# Altium footprint library User.PcbLib: 317 footprints (part 6 of 20)
Each footprint in its own frame and in the unit in brackets; x right, y up, seen from the top. Pads: shape width x height; smd on the part's side, far side on the other; paste and mask are expansions set on the pad; w line width, h text height; cw(c..) or ccw(c..) is an arc to the next point about the centre after c.
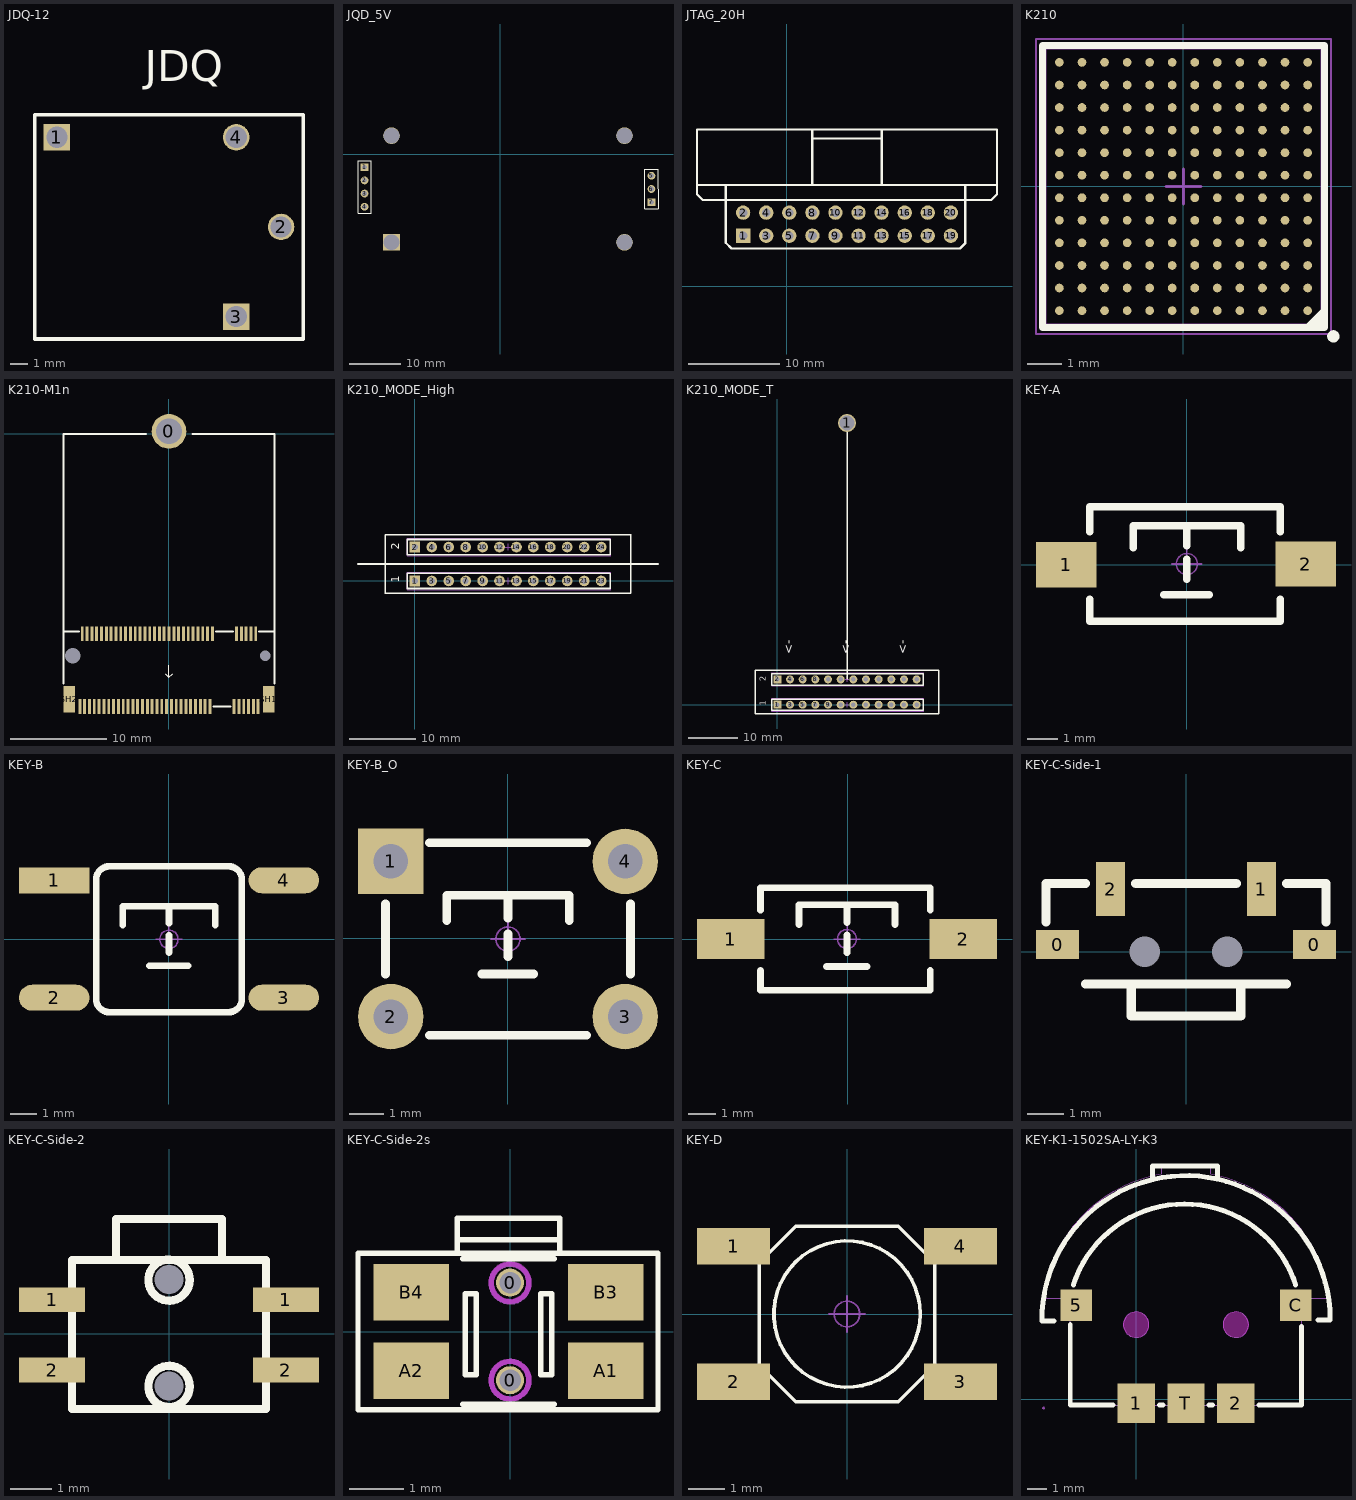
[diagram p5: the footprints below, top view; thin cyan lines are the x and y axes]

## JDQ-12 [mm]
pads (4):
  rect 1.5x1.5 hole 1.2: 1(-131.98,-213.57) 3(-121.82,-223.73)
  round 1.5 hole 1.2: 2(-119.28,-218.65) 4(-121.82,-213.57)
Top Overlay:
  lines w0.2: -133.25,-225 -130.71,-225 -128.17,-225 -125.63,-225 -123.09,-225 -120.55,-225 -118.01,-225 -118.01,-212.3 -120.55,-212.3 -123.09,-212.3 -125.63,-212.3 -128.17,-212.3 -130.71,-212.3 -133.25,-212.3 -133.25,-225
  text "JDQ" at -127,-211 h3
3D body: height 10, standoff 2, extent -134,-226 -117,-212

## JQD_5V [mm]
pads (11):
  rect 1.5x1.5 hole 0.9: 1(-26.2,-2.5) 7(29.2,-9.24)
  round 1.5 hole 0.9: 2(-26.2,-5.04) 3(-26.2,-7.58) 4(-26.2,-10.12) 5(29.2,-4.16) 6(29.2,-6.7)
  rect 3.2x3.2 hole 3: ""(-21,-17)
  round 3.2 hole 3: ""(-21,3.6) ""(24,-17) ""(24,3.6)
Top Overlay:
  lines w0.2: -27.47,-11.39 -24.93,-11.39 -24.93,-1.23 -27.47,-1.23 -27.47,-11.39 ; 27.93,-10.51 30.47,-10.51 30.47,-2.89 27.93,-2.89 27.93,-10.51

## JTAG_20H [mil]
pads (20):
  rect 62x62 hole 38: 1(-188.98,218.9)
  round 62 hole 38: 2(-188.98,318.9) 3(-88.98,218.9) 4(-88.98,318.9) 5(11.02,218.9) 6(11.02,318.9) 7(111.02,218.9) 8(111.02,318.9) 9(211.02,218.9) 10(211.02,318.9) 11(311.02,218.9) 12(311.02,318.9) 13(411.02,218.9) 14(411.02,318.9) 15(511.02,218.9) 16(511.02,318.9) 17(611.02,218.9) 18(611.02,318.9) 19(711.02,218.9) 20(711.02,318.9)
Top Overlay:
  lines w8: -265.1,438.9 -263.98,437.78
  lines w10: -263.98,437.78 -263.98,188.9 -238.98,163.9 751.02,163.9 772.9,185.78 772.9,438.9 ; 111.02,442.3 111.02,658.9 ; 111.02,678.9 111.02,639.97 411.02,639.97 411.02,678.9 ; 411.02,440.47 411.02,658.9 ; -388.98,438.9 -388.98,398.9 -363.98,373.9 -263.98,373.9 772.9,373.9 886.02,373.9 911.02,398.9 911.02,438.9 ; -388.98,438.9 -388.98,678.9 911.02,678.9 911.02,438.9 ; -388.98,438.9 911.02,438.9

## K210 [mm]
pads (144):
  round 0.25 smd mask+0.051: A1(3.575,-3.575) A2(2.925,-3.575) A3(2.275,-3.575) A4(1.625,-3.575) A5(0.975,-3.575) A6(0.325,-3.575) A7(-0.325,-3.575) A8(-0.975,-3.575) A9(-1.625,-3.575) A10(-2.275,-3.575) A11(-2.925,-3.575) A12(-3.575,-3.575) B1(3.575,-2.925) B2(2.925,-2.925) B3(2.275,-2.925) B4(1.625,-2.925) B5(0.975,-2.925) B6(0.325,-2.925) B7(-0.325,-2.925) B8(-0.975,-2.925) B9(-1.625,-2.925) B10(-2.275,-2.925) B11(-2.925,-2.925) B12(-3.575,-2.925) C1(3.575,-2.275) C2(2.925,-2.275) C3(2.275,-2.275) C4(1.625,-2.275) C5(0.975,-2.275) C6(0.325,-2.275) C7(-0.325,-2.275) C8(-0.975,-2.275) C9(-1.625,-2.275) C10(-2.275,-2.275) C11(-2.925,-2.275) C12(-3.575,-2.275) D1(3.575,-1.625) D2(2.925,-1.625) D3(2.275,-1.625) D4(1.625,-1.625) D5(0.975,-1.625) D6(0.325,-1.625) D7(-0.325,-1.625) D8(-0.975,-1.625) D9(-1.625,-1.625) D10(-2.275,-1.625) D11(-2.925,-1.625) D12(-3.575,-1.625) E1(3.575,-0.975) E2(2.925,-0.975) E3(2.275,-0.975) E4(1.625,-0.975) E5(0.975,-0.975) E6(0.325,-0.975) E7(-0.325,-0.975) E8(-0.975,-0.975) E9(-1.625,-0.975) E10(-2.275,-0.975) E11(-2.925,-0.975) E12(-3.575,-0.975) F1(3.575,-0.325) F2(2.925,-0.325) F3(2.275,-0.325) F4(1.625,-0.325) F5(0.975,-0.325) F6(0.325,-0.325) F7(-0.325,-0.325) F8(-0.975,-0.325) F9(-1.625,-0.325) F10(-2.275,-0.325) F11(-2.925,-0.325) F12(-3.575,-0.325) G1(3.575,0.325) G2(2.925,0.325) G3(2.275,0.325) G4(1.625,0.325) G5(0.975,0.325) G6(0.325,0.325) G7(-0.325,0.325) G8(-0.975,0.325) G9(-1.625,0.325) G10(-2.275,0.325) G11(-2.925,0.325) G12(-3.575,0.325) H1(3.575,0.975) H2(2.925,0.975) H3(2.275,0.975) H4(1.625,0.975) H5(0.975,0.975) H6(0.325,0.975) H7(-0.325,0.975) H8(-0.975,0.975) H9(-1.625,0.975) H10(-2.275,0.975) H11(-2.925,0.975) H12(-3.575,0.975) J1(3.575,1.625) J2(2.925,1.625) J3(2.275,1.625) J4(1.625,1.625) J5(0.975,1.625) J6(0.325,1.625) J7(-0.325,1.625) J8(-0.975,1.625) J9(-1.625,1.625) J10(-2.275,1.625) J11(-2.925,1.625) J12(-3.575,1.625) K1(3.575,2.275) K2(2.925,2.275) K3(2.275,2.275) K4(1.625,2.275) K5(0.975,2.275) K6(0.325,2.275) K7(-0.325,2.275) K8(-0.975,2.275) K9(-1.625,2.275) K10(-2.275,2.275) K11(-2.925,2.275) K12(-3.575,2.275) L1(3.575,2.925) L2(2.925,2.925) L3(2.275,2.925) L4(1.625,2.925) L5(0.975,2.925) L6(0.325,2.925) L7(-0.325,2.925) L8(-0.975,2.925) L9(-1.625,2.925) L10(-2.275,2.925) L11(-2.925,2.925) L12(-3.575,2.925) M1(3.575,3.575) M2(2.925,3.575) M3(2.275,3.575) M4(1.625,3.575) M5(0.975,3.575) M6(0.325,3.575) M7(-0.325,3.575) M8(-0.975,3.575) M9(-1.625,3.575) M10(-2.275,3.575) M11(-2.925,3.575) M12(-3.575,3.575)
Top Overlay:
  circle w0.2: c4.318,-4.318 r0.076
  region: 4.064,-4.064 3.429,-4.064 4.064,-3.429
  lines w0.2: -4.064,-4.064 -4.064,4.064 4.064,4.064 4.064,-4.064 -4.064,-4.064
Mechanical 13:
  lines w0.1: -4,-4 -4,4 4,4 4,-4 -4,-4
Mechanical 15:
  lines w0.05: -4.25,-4.25 4.25,-4.25 4.25,4.25 -4.25,4.25 -4.25,-4.25
  lines w0.1: -0.5,0 0.5,0 ; 0,-0.5 0,0.5
3D body "BGA144C65P12X12_800X800X95.step": height 0.95, standoff 0.01, extent -4,-4 4,4

## K210-M1n [mm]
pads (72):
  round 3.6 hole 2.65 mask+0.051: 0(0,0.254)
  rect 0.3x1.55 smd: 1(9.25,-28.287) 2(9,-20.737) 3(8.75,-28.287) 4(8.5,-20.737) 5(8.25,-28.287) 6(8,-20.737) 7(7.75,-28.287) 8(7.5,-20.737) 9(7.25,-28.287) 10(7,-20.737) 11(6.75,-28.287) 20(4.5,-20.737) 21(4.25,-28.287) 22(4,-20.737) 23(3.75,-28.287) 24(3.5,-20.737) 25(3.25,-28.287) 26(3,-20.737) 27(2.75,-28.287) 28(2.5,-20.737) 29(2.25,-28.287) 30(2,-20.737) 31(1.75,-28.287) 32(1.5,-20.737) 33(1.25,-28.287) 34(1,-20.737) 35(0.75,-28.287) 36(0.5,-20.737) 37(0.25,-28.287) 38(0,-20.737) 39(-0.25,-28.287) 40(-0.5,-20.737) 41(-0.75,-28.287) 42(-1,-20.737) 43(-1.25,-28.287) 44(-1.5,-20.737) 45(-1.75,-28.287) 46(-2,-20.737) 47(-2.25,-28.287) 48(-2.5,-20.737) 49(-2.75,-28.287) 50(-3,-20.737) 51(-3.25,-28.287) 52(-3.5,-20.737) 53(-3.75,-28.287) 54(-4,-20.737) 55(-4.25,-28.287) 56(-4.5,-20.737) 57(-4.75,-28.287) 58(-5,-20.737) 59(-5.25,-28.287) 60(-5.5,-20.737) 61(-5.75,-28.287) 62(-6,-20.737) 63(-6.25,-28.287) 64(-6.5,-20.737) 65(-6.75,-28.287) 66(-7,-20.737) 67(-7.25,-28.287) 68(-7.5,-20.737) 69(-7.75,-28.287) 70(-8,-20.737) 71(-8.25,-28.287) 72(-8.5,-20.737) 73(-8.75,-28.287) 74(-9,-20.737) 75(-9.25,-28.287)
  round 0 / inner round 1.524 / far side round 1.6 hole 1.6: " "(-10,-23.012)
  round 0 / inner round 1.524 / far side round 1.1 hole 1.1: " "(10,-23.012)
  rect 1.2x2.75 smd: SH1(10.35,-27.512) SH2(-10.35,-27.512)
Top Overlay:
  lines w0.125: -0.375,-24.887 0,-25.262 ; 0,-24.012 0,-25.262 ; 0.375,-24.887 0,-25.262
  lines w0.2: -10.95,-25.912 -10.95,-20.512 -9.35,-20.512 ; -10.95,-20.512 -10.95,0 -2.388,0 ; 2.413,0 10.95,0 10.95,-20.512 ; 4.6,-28.262 6.4,-28.262 ; 4.85,-20.512 6.65,-20.512 ; 9.35,-20.512 10.95,-20.512 ; 10.95,-25.912 10.95,-20.512
3D body "K210-NGFF-2663.step": height 5.5, standoff 2.21, extent -11.034,-24.865 10.947,0.125
3D body "2377473_2199230-3.stp": height 4.09, standoff -0.61, extent -10.95,-28.862 10.95,-20.162

## K210_MODE_High [mm] "li"
pads (24):
  rect 1.6x1.6 hole 0.9: 1(0,0) 2(0,5.08)
  round 1.6 hole 0.9: 3(2.54,0) 4(2.54,5.08) 5(5.08,0) 6(5.08,5.08) 7(7.62,0) 8(7.62,5.08) 9(10.16,0) 10(10.16,5.08) 11(12.7,0) 12(12.7,5.08) 13(15.24,0) 14(15.24,5.08) 15(17.78,0) 16(17.78,5.08) 17(20.32,0) 18(20.32,5.08) 19(22.86,0) 20(22.86,5.08) 21(25.4,0) 22(25.4,5.08) 23(27.94,0) 24(27.94,5.08)
Top Overlay:
  lines w0.254: -8.53,2.54 36.47,2.54 ; -4.445,-1.86 -4.445,6.94 32.385,6.94 ; -4.445,-1.86 -4.445,-1.86 ; -4.445,-1.86 32.385,-1.86 ; 32.385,-1.86 32.385,-1.86 ; 32.385,-1.86 32.385,6.94 ; 32.385,6.94 32.385,6.94 ; -1.143,-1.143 29.3,-1.143 29.3,1.143 -1.143,1.143 -1.143,-1.143 ; -1.143,3.937 29.3,3.937 29.3,6.223 -1.143,6.223 -1.143,3.937
  text "2" at -1.905,4.699 h2.03
  text "1" at -1.905,-0.254 h2.03
Mechanical 15:
  lines w0.1: 13.47,0 14.47,0 ; 13.47,5.08 14.47,5.08 ; 13.97,-0.5 13.97,0.5 ; 13.97,4.58 13.97,5.58 ; -1.13,-1.3 29.37,-1.3 29.37,1.3 -1.13,1.3 -1.13,-1.3 ; -1.13,3.78 29.37,3.78 29.37,6.38 -1.13,6.38 -1.13,3.78
3D body: height 15, standoff 0, extent -4.445,-1.86 -1.778,6.94
3D body: height 15, standoff 0, extent 29.718,-1.86 32.385,6.94
3D body: height 15, standoff 0, extent -1.778,-1.86 29.718,-1.228
3D body: height 15, standoff 0, extent -1.778,6.38 29.718,6.94
3D body: height 40, standoff 8, extent -1.143,1.397 29.337,3.81
3D body "HEADER 2.54X12.stp": height 8.3, standoff -2.9, extent -1.143,-1.228 29.337,1.27
3D body "HEADER 2.54X12.stp": height 8.3, standoff -2.9, extent -1.143,3.852 29.337,6.35

## K210_MODE_T [mm]
pads (25):
  rect 1.6x1.6 hole 0.9: 1(0,0) 2(0,5.08)
  round 3.6 hole 3.048: 1(13.97,56.53)
  round 1.6 hole 0.9: 3(2.54,0) 4(2.54,5.08) 5(5.08,0) 6(5.08,5.08) 7(7.62,0) 8(7.62,5.08) 9(10.16,0) 10(10.16,5.08) 11(12.7,0) 12(12.7,5.08) 13(15.24,0) 14(15.24,5.08) 15(17.78,0) 16(17.78,5.08) 17(20.32,0) 18(20.32,5.08) 19(22.86,0) 20(22.86,5.08) 21(25.4,0) 22(25.4,5.08) 23(27.94,0) 24(27.94,5.08)
Top Overlay:
  lines w0.254: 13.97,5.08 13.97,56.53 ; -4.445,-1.86 -4.445,6.94 32.385,6.94 ; -4.445,-1.86 -4.445,-1.86 ; -4.445,-1.86 32.385,-1.86 ; 32.385,-1.86 32.385,-1.86 ; 32.385,-1.86 32.385,6.94 ; 32.385,6.94 32.385,6.94 ; -1.143,-1.143 29.3,-1.143 29.3,1.143 -1.143,1.143 -1.143,-1.143 ; -1.143,3.937 29.3,3.937 29.3,6.223 -1.143,6.223 -1.143,3.937
  text "2" at -1.905,4.699 h2.03
  text "1" at -1.905,-0.254 h2.03
  text "<-" at 3.717,10.08 h3.05
  text "<-" at 26.577,10.08 h3.05
  text "<-" at 15.147,10.08 h3.05
Mechanical 15:
  lines w0.1: 13.47,0 14.47,0 ; 13.47,5.08 14.47,5.08 ; 13.97,-0.5 13.97,0.5 ; 13.97,4.58 13.97,5.58 ; -1.13,-1.3 29.37,-1.3 29.37,1.3 -1.13,1.3 -1.13,-1.3 ; -1.13,3.78 29.37,3.78 29.37,6.38 -1.13,6.38 -1.13,3.78
3D body: height 15, standoff 0, extent -4.445,-1.86 -1.778,20.08
3D body: height 15, standoff 0, extent 29.718,-1.86 32.385,20.066
3D body: height 15, standoff 0, extent -1.778,-1.86 29.718,-1.228
3D body: height 5, standoff 0, extent -1.778,6.38 29.718,6.94
3D body "HEADER 2.54X12.stp": height 8.3, standoff -2.9, extent -1.143,-1.228 29.337,1.27
3D body "HEADER 2.54X12.stp": height 8.3, standoff -2.9, extent -1.143,3.852 29.337,6.35
3D body: height 17, standoff 15, extent -3.937,-1.86 31.877,20.08
3D body: height 4, standoff 1, extent -1.778,6.94 29.718,20.08
3D body: height 8, standoff 6.8, extent -8.556,12.071 36.444,56.568

## KEY-A [mm]
pads (2):
  rect 2x1.5 smd: 1(-3.996,0.005) 2(3.937,0.025)
Top Overlay:
  lines w0.254: -3.212,-1.143 -3.212,-1.875 3.088,-1.875 3.088,-1.143 ; -3.212,1.092 -3.212,1.925 3.088,1.925 3.088,1.092 ; -1.778,0.559 -1.778,1.295 1.778,1.295 1.778,0.559 ; -0.762,-0.991 0.737,-0.991 ; 0,-0.483 0,0.178 ; 0,0.635 0,1.295
Mechanical 15:
  circle w0.05: c0,0.025 r0.35
  lines w0.05: -0.5,0.025 0.5,0.025 ; 0,-0.475 0,0.525
3D body "TSW SMD-3x6x2.5.STEP": height 2.59, standoff -0.03, extent -4,-1.851 4,1.648

## KEY-B [mm]
pads (4):
  rect 2.7x1 smd: 1(-4.4,2.261)
  oval 2.7x1 smd: 2(-4.4,-2.239) 3(4.4,-2.239) 4(4.4,2.261)
Top Overlay:
  lines w0.254: -1.778,0.533 -1.778,1.27 1.778,1.27 1.778,0.533 ; -0.762,-1.016 0.737,-1.016 ; 0,-0.508 0,0.152 ; 0,0.61 0,1.27 ; -2.794,-2.286 ccw(c-2.286,-2.286) -2.286,-2.794 2.286,-2.794 ccw(c2.286,-2.286) 2.794,-2.286 2.794,2.286 ccw(c2.286,2.286) 2.286,2.794 -2.286,2.794 ccw(c-2.286,2.286) -2.794,2.286 -2.794,-2.286
Mechanical 15:
  circle w0.05: c0,0 r0.35
  lines w0.05: -0.5,0 0.5,0 ; 0,-0.5 0,0.5
3D body "TSW SMD-6x6x5.STEP": height 4.95, standoff -0.03, extent -4.5,-3 4.5,3

## KEY-B_O [mm] "6*6*6mm"
pads (4):
  rect 1.9x1.9 hole 1: 1(-3.4,2.225)
  round 1.9 hole 1: 2(-3.4,-2.275) 3(3.4,-2.275) 4(3.4,2.225)
Top Overlay:
  lines w0.254: -3.556,-1.041 -3.556,0.991 ; -2.286,-2.819 2.286,-2.819 ; -2.286,2.769 2.286,2.769 ; -1.778,0.508 -1.778,1.245 1.778,1.245 1.778,0.508 ; -0.762,-1.041 0.737,-1.041 ; 0,-0.533 0,0.127 ; 0,0.584 0,1.245 ; 3.556,-1.041 3.556,0.991
Bottom Overlay:
  lines w0.254: -2.286,-2.311 2.286,-2.311 ; -2.286,2.261 2.286,2.261
Mechanical 15:
  circle w0.05: c0,-0.025 r0.35
  lines w0.05: -0.5,-0.025 0.5,-0.025 ; 0,-0.525 0,0.475
3D body "TSW DIP-6x6x6.STEP": height 5.95, standoff -3.45, extent -4.106,-3.025 4.106,2.975

## KEY-C [mm]
pads (2):
  rect 2.5x1.5 smd: 1(-4.343,0) 2(4.293,0)
Top Overlay:
  lines w0.254: -3.237,-1.168 -3.237,-1.9 3.063,-1.9 3.063,-1.168 ; -3.237,1.067 -3.237,1.9 3.063,1.9 3.063,1.067 ; -1.803,0.533 -1.803,1.27 1.753,1.27 1.753,0.533 ; -0.787,-1.016 0.711,-1.016 ; -0.025,-0.508 -0.025,0.152 ; -0.025,0.61 -0.025,1.27
Mechanical 15:
  circle w0.05: c-0.025,0 r0.35
  lines w0.05: -0.525,0 0.475,0 ; -0.025,-0.5 -0.025,0.5
3D body "TSW SMD-3x6x5.STEP": height 5.1, standoff -0.03, extent -4.625,-1.75 4.575,1.75

## KEY-C-Side-1 [mm] "3*6*4.3"
pads (6):
  rect 1.2x0.8 smd: 0(-3.575,0.207) 0(3.575,0.207)
  round 0 hole 0.85: 0(-1.15,0) 0(1.15,0)
  rect 0.8x1.5 smd: 1(2.1,1.75) 2(-2.1,1.75)
Top Overlay:
  lines w0.254: -3.9,0.838 -3.9,1.9 -3.895,1.905 -2.794,1.905 ; -2.794,-0.889 2.794,-0.889 ; -1.524,-0.889 -1.524,-1.778 1.524,-1.778 1.524,-0.889 ; -1.397,1.905 1.397,1.905 ; 2.794,1.905 3.895,1.905 3.9,1.91 3.9,0.838
3D body "TSW 3x6x4.3-S-W.STEP": height 3.51, standoff -0.74, extent -3.9,-1.79 3.9,1.91

## KEY-C-Side-2 [mm]
pads (6):
  round 0 hole 0.7: 0(0,-1.26) 0(0,1.314)
  rect 1.6x0.6 smd: 1(-2.832,0.826) 1(2.832,0.826) 2(-2.832,-0.876) 2(2.832,-0.876)
Top Overlay:
  circle w0.2: c0,-1.27 r0.5
  circle w0.2: c0,1.304 r0.5
  lines w0.2: -1.283,1.811 -1.283,2.781 1.283,2.781 1.283,1.811 ; -2.349,-1.816 2.349,-1.816 2.349,1.791 -2.349,1.791 -2.349,-1.816
3D body "零": height 1.63, standoff -0.02, extent -2.959,-1.719 2.941,2.781

## KEY-C-Side-2s [mm]
pads (6):
  round 0.52 hole 0.4: 0(0,-0.9) 0(0,0.91)
  rect 1.4x1.05 smd: A1(1.772,-0.722) A2(-1.828,-0.722) B3(1.772,0.728) B4(-1.828,0.728)
Top Overlay:
  lines w0.1: -0.978,1.703 0.922,1.703 ; -0.878,-1.347 0.822,-1.347 ; -0.878,1.353 0.822,1.353 ; -0.978,1.453 -0.978,2.103 0.922,2.103 0.922,1.703 ; -0.978,1.453 -2.819,1.453 -2.819,-1.447 2.743,-1.447 2.743,1.453 0.922,1.453 ; -0.978,1.453 0.922,1.453 ; 0.922,1.453 0.922,1.703 ; -0.828,-0.797 -0.628,-0.797 -0.628,0.703 -0.828,0.703 -0.828,-0.797 ; 0.572,-0.797 0.772,-0.797 0.772,0.703 0.572,0.703 0.572,-0.797
Keep-Out Layer:
  circle w0.1: c0,0.91 r0.35
  circle w0.1: c0,-0.9 r0.35
Mechanical 1:
  circle w0.1: c0,0.9 r0.35
  circle w0.1: c0,-0.9 r0.35
3D body "User Library-EVQP7-JA-01P.STEP": height 1.35, standoff 0, extent -2.35,-1.46 2.35,2.09

## KEY-D [mm] "4*4mm"
pads (4):
  rect 2x1 smd: 1(-3.1,1.85) 2(-3.1,-1.85) 3(3.1,-1.85) 4(3.1,1.85)
Top Overlay:
  circle w0.1: c0,0 r2
  lines w0.1: -2.4,-1.4 -2.4,1.4 -1.4,2.4 1.4,2.4 2.4,1.4 2.4,-1.4 1.4,-2.4 -1.4,-2.4 -2.4,-1.4 ; 0,-2.4 0,-2.4 ; 0,2.4 0,2.4
Mechanical 15:
  circle w0.05: c0,0 r0.35
  lines w0.05: -0.5,0 0.5,0 ; 0,-0.5 0,0.5
3D body "4x4x1.8.STEP": height 1.8, standoff -0.05, extent -3.2,-2.6 3.2,2.6

## KEY-K1-1502SA-LY-K3 [mm]
pads (5):
  rect 1.9x2 smd mask+0.051: 1(0,-0.2) 2(5.08,-0.2) T(2.54,-0.2)
  rect 1.6x1.6 smd mask+0.051: 5(-3.06,4.801) C(8.14,4.801)
Top Overlay:
  lines w0.254: -4.19,3.999 -4.81,4 cw(c2.54,4.05) 9.89,4.1 ; -3.36,3.8 -3.36,-0.3 -1.181,-0.3 ; -3.205,5.828 cw(c2.463,4) 8.131,5.828 ; 0.841,11.201 0.841,11.9 4.14,11.9 4.14,11.25 ; 1.181,-0.3 1.359,-0.3 ; 3.721,-0.3 3.899,-0.3 ; 6.261,-0.3 8.44,-0.3 8.44,3.701 ; 9.271,4.051 9.891,4.049
Keep-Out Layer:
  board cut-out: 0.65,3.8 0.65,3.885 0.606,4.051 0.52,4.199 0.399,4.32 0.251,4.406 0.086,4.45 -0.086,4.45 -0.251,4.406 -0.399,4.32 -0.52,4.199 -0.606,4.051 -0.65,3.885 -0.65,3.8 -0.65,3.714 -0.606,3.549 -0.52,3.401 -0.399,3.28 -0.251,3.194 -0.086,3.15 0.086,3.15 0.251,3.194 0.399,3.28 0.52,3.401 0.606,3.549 0.65,3.714
  board cut-out: 5.73,3.8 5.73,3.885 5.686,4.051 5.6,4.199 5.479,4.32 5.331,4.406 5.166,4.45 4.994,4.45 4.829,4.406 4.681,4.32 4.56,4.199 4.474,4.051 4.43,3.885 4.43,3.8 4.43,3.714 4.474,3.549 4.56,3.401 4.681,3.28 4.829,3.194 4.994,3.15 5.166,3.15 5.331,3.194 5.479,3.28 5.6,3.401 5.686,3.549 5.73,3.714
Mechanical 1:
  circle w0.005: c0,3.8 r0.65
  circle w0.005: c5.08,3.8 r0.65
Mechanical 15:
  region: -4.653,-0.45 -4.653,-0.424 -4.689,-0.389 -4.739,-0.389 -4.775,-0.424 -4.775,-0.45 -4.775,-0.475 -4.739,-0.511 -4.689,-0.511 -4.653,-0.475
  region: 4.331,0.699 5.829,0.699 5.829,-0.45 4.331,-0.45
  region: 1.791,0.699 3.289,0.699 3.289,-0.45 1.791,-0.45
  region: -0.749,0.699 0.749,0.699 0.749,-0.45 -0.749,-0.45
  region: -3.358,4.201 -3.358,5.4 -2.459,5.4 -2.459,4.201
  region: 7.539,4.201 7.539,5.4 8.438,5.4 8.438,4.201
  lines w0.051: -4.714,5.151 -3.371,5.143 -3.363,4 -3.363,-0.3 8.435,-0.3 8.435,3.701 8.435,4.051 8.451,5.143 9.794,5.154 9.685,5.85 9.459,6.642 9.253,7.236 8.839,8.004 8.738,8.113 8.397,8.694 7.904,9.263 7.46,9.703 7.089,10.015 6.477,10.457 5.636,10.914 5.131,11.118 4.651,11.285 4.227,11.407 3.795,11.491 3.795,11.796 3.787,11.803 3.782,11.814 3.764,11.849 3.746,11.874 3.729,11.892 3.703,11.91 3.655,11.923 3.416,11.946 2.954,11.989 2.672,11.994 2.156,11.989 1.633,11.941 1.491,11.928 1.43,11.923 1.382,11.91 1.369,11.905 1.351,11.892 1.333,11.874 1.285,11.803 1.288,11.491 0.869,11.412 0.429,11.293 -0.165,11.082 -0.584,10.902 -1.135,10.607 -1.519,10.373 -2.024,10.003 -2.372,9.703 -2.606,9.487 -2.822,9.263 -3.086,8.959 -3.205,8.809 -3.495,8.412 -3.746,8.029 -4.034,7.483 -4.219,7.069 -4.381,6.647 -4.425,6.497 -4.544,6.06 -4.605,5.839 -4.623,5.735 -4.646,5.593 -4.671,5.443 -4.714,5.151
3D body "3D_PCB6_2022-03-06.step": height 2.6, standoff -0.4, extent -4.71,-0.394 9.79,12.047